# Altium footprint library self_pcblib v1.8.6.PcbLib: 123 footprints (part 4 of 8)
Each footprint in its own frame and in the unit in brackets; x right, y up, seen from the top. Pads: shape width x height; smd on the part's side, far side on the other; paste and mask are expansions set on the pad; w line width, h text height; cw(c..) or ccw(c..) is an arc to the next point about the centre after c.
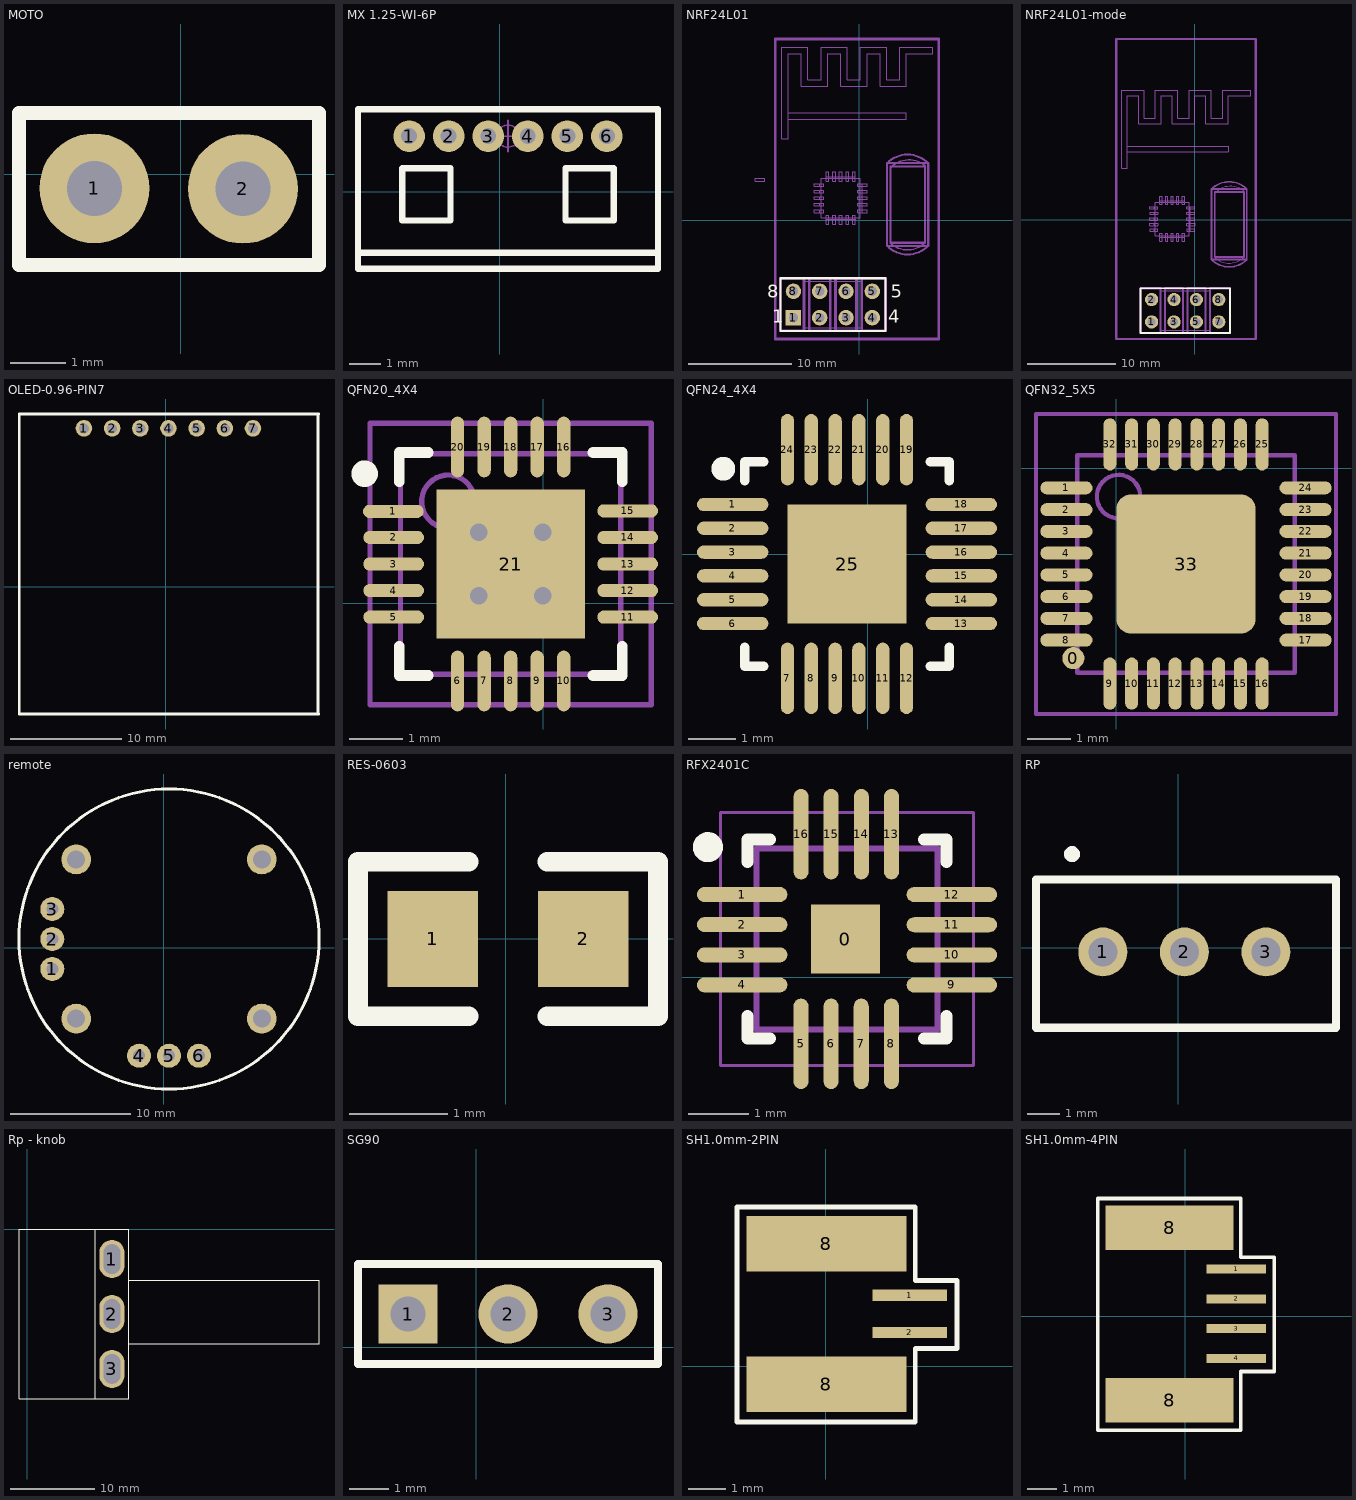
[diagram p3: the footprints below, top view; thin cyan lines are the x and y axes]

## MOTO [mm]
pads (2):
  round 2 hole 1: 1(-1.575,-0.254) 2(1.129,-0.262)
Top Overlay:
  lines w0.254: -2.946,-1.651 -2.946,1.118 2.515,1.118 2.515,-1.651 -2.946,-1.651

## MX 1.25-WI-6P [mm]
pads (6):
  round 1 hole 0.5: 1(-2.859,1.755) 2(-1.609,1.755) 3(-0.359,1.755) 4(0.891,1.755) 5(2.141,1.755) 6(3.391,1.755)
Top Overlay:
  lines w0.2: -4.473,-1.928 5.005,-1.928 ; -4.473,-2.436 5.005,-2.436 5.005,2.605 -4.473,2.605 -4.473,-2.436 ; -3.076,-0.912 -1.552,-0.912 -1.552,0.739 -3.076,0.739 -3.076,-0.912 ; 2.084,-0.912 3.608,-0.912 3.608,0.739 2.084,0.739 2.084,-0.912
Mechanical 15:
  circle w0.05: c0.266,1.755 r0.35
  lines w0.05: -0.234,1.755 0.766,1.755 ; 0.266,1.255 0.266,2.255
3D body "MOLEX1.25-WI-6P.STEP": height 3.35, standoff -2.1, extent -4.359,-2.295 4.891,2.605

## NRF24L01 [mm]
pads (8):
  rect 1.5x1.5 hole 0.9: 1(-6.35,-9.398)
  round 1.5 hole 0.9: 2(-3.81,-9.398) 3(-1.27,-9.398) 4(1.27,-9.398) 5(1.27,-6.858) 6(-1.27,-6.858) 7(-3.81,-6.858) 8(-6.35,-6.858)
Top Overlay:
  lines w0.2: -7.62,-10.668 -7.62,-5.588 2.54,-5.588 2.54,-10.668 -7.62,-10.668
  text "8" at -8.89,-7.493 h1.27
  text "4" at 2.794,-9.906 h1.27
  text "1" at -8.382,-9.906 h1.27
  text "5" at 3.048,-7.493 h1.27
Mechanical 1:
  drawing of 171 lines, arcs and shapes, not listed
3D body: height 3.01, standoff 3, extent -6.858,9.779 4.572,10.414
3D body: height 3.01, standoff 3, extent -7.493,7.874 7.112,16.764
3D body: height 3.25, standoff 3, extent -0.635,3.81 -0.381,4.219
3D body: height 3.25, standoff 3, extent -1.27,3.81 -1.016,4.219
3D body: height 3.25, standoff 3, extent -1.905,3.81 -1.651,4.219
3D body: height 3.25, standoff 3, extent -2.54,3.81 -2.286,4.219
3D body: height 3.25, standoff 3, extent -3.175,3.81 -2.921,4.229
3D body: height 3.25, standoff 3, extent -3.81,3.302 -3.429,3.556
3D body: height 3.25, standoff 3, extent -3.828,2.667 -3.429,2.921
3D body: height 3.25, standoff 3, extent -3.828,2.032 -3.429,2.286
3D body: height 3.25, standoff 3, extent -3.828,1.397 -3.429,1.651
3D body: height 3.25, standoff 3, extent -3.828,0.762 -3.429,1.016
3D body: height 3.25, standoff 3, extent -3.175,0.099 -2.921,0.508
3D body: height 3.25, standoff 3, extent -2.54,0.099 -2.286,0.508
3D body: height 3.25, standoff 3, extent -1.918,0.099 -1.651,0.508
3D body: height 3.25, standoff 3, extent -1.27,0.099 -1.016,0.508
3D body: height 3.25, standoff 3, extent -0.635,0.089 -0.381,0.508
3D body: height 3.25, standoff 3, extent -0.127,0.762 0.282,1.016
3D body: height 3.25, standoff 3, extent -0.127,1.397 0.282,1.651
3D body: height 3.25, standoff 3, extent -0.127,2.032 0.282,2.286
3D body: height 3.25, standoff 3, extent -0.127,2.667 0.282,2.921
3D body: height 3.25, standoff 3, extent -0.127,3.302 0.282,3.556
3D body: height 3.1, standoff 3, extent -3.175,4.229 -2.921,4.699
3D body: height 3.1, standoff 3, extent -2.54,4.229 -2.286,4.699
3D body: height 3.1, standoff 3, extent -1.905,4.219 -1.651,4.699
3D body: height 3.1, standoff 3, extent -1.27,4.229 -1.016,4.699
3D body: height 3.1, standoff 3, extent -0.648,4.219 -0.381,4.699
3D body: height 3.1, standoff 3, extent 0.282,3.302 0.762,3.556
3D body: height 3.1, standoff 3, extent 0.282,2.667 0.762,2.921
3D body: height 3.1, standoff 3, extent 0.282,2.032 0.762,2.286
3D body: height 3.1, standoff 3, extent 0.282,1.397 0.762,1.651
3D body: height 3.1, standoff 3, extent 0.282,0.762 0.762,1.016
3D body: height 3.1, standoff 3, extent -0.635,-0.381 -0.381,0.099
3D body: height 3.1, standoff 3, extent -1.27,-0.381 -1.016,0.099
3D body: height 3.1, standoff 3, extent -1.905,-0.381 -1.651,0.099
3D body: height 3.1, standoff 3, extent -2.54,-0.381 -2.286,0.099
3D body: height 3.1, standoff 3, extent -3.175,-0.381 -2.908,0.099
3D body: height 3.1, standoff 3, extent -4.318,0.762 -3.828,1.016
3D body: height 3.1, standoff 3, extent -4.318,1.397 -3.828,1.651
3D body: height 3.1, standoff 3, extent -4.313,2.032 -3.823,2.286
3D body: height 3.1, standoff 3, extent -4.318,2.667 -3.828,2.921
3D body: height 3.1, standoff 3, extent -4.318,3.302 -3.81,3.556
3D body: height 3.5, standoff 3, extent -3.683,0.254 0.127,4.064
3D body: height 5, standoff 3.5, extent 3.048,-2.159 6.35,5.207
3D body: height 5, standoff 3, extent 3.11,-2.736 6.543,0.69
3D body: height 5, standoff 3, extent 2.983,2.598 6.416,6.024
3D body: height 3.5, standoff 3, extent 2.586,-3.561 6.778,0.622
3D body: height 3.5, standoff 3, extent 2.586,2.439 6.778,6.622
3D body: height 3.5, standoff 3, extent 2.682,-2.461 6.682,5.539
3D body: height 4, standoff 0, extent 0.921,-9.748 1.62,-9.051
3D body: height 4, standoff 0, extent 0.921,-7.208 1.62,-6.511
3D body: height 4, standoff 0, extent -1.619,-7.208 -0.92,-6.511
3D body: height 4, standoff 0, extent -1.619,-9.748 -0.92,-9.051
3D body: height 4, standoff 0, extent -4.159,-9.748 -3.46,-9.051
3D body: height 4, standoff 0, extent -4.159,-7.208 -3.461,-6.511
3D body: height 4, standoff 0, extent -6.699,-7.208 -6.001,-6.511
3D body: height 4, standoff 0, extent -6.699,-9.748 -6.001,-9.051
3D body: height 4, standoff 0, extent -6.699,-9.748 -6,-9.051
3D body: height 4, standoff 0, extent -6.699,-7.208 -6,-6.511
3D body: height 4, standoff 0, extent -4.159,-9.748 -3.46,-9.051
3D body: height 4, standoff 0, extent -4.159,-7.208 -3.46,-6.511
3D body: height 4, standoff 0, extent -1.619,-9.748 -0.92,-9.051
3D body: height 4, standoff 0, extent -1.619,-7.208 -0.92,-6.511
3D body: height 4, standoff 0, extent 0.921,-9.748 1.62,-9.051
3D body: height 4, standoff 0, extent 0.921,-7.208 1.619,-6.511
3D body: height 3, standoff 2, extent -8.118,-11.461 7.682,17.539
3D body: height 2, standoff 0, extent -7.62,-10.668 -5.334,-5.588
3D body: height 2, standoff 0, extent -5.334,-10.361 -4.826,-5.861
3D body: height 2, standoff 0, extent -4.826,-10.668 -2.794,-5.588
3D body: height 2, standoff 0, extent -2.818,-10.361 -2.286,-5.861
3D body: height 2, standoff 0, extent -2.286,-10.668 -0.254,-5.588
3D body: height 2, standoff 0, extent -0.254,-10.361 0.254,-5.861
3D body: height 2, standoff 0, extent 0.254,-10.668 2.54,-5.588

## NRF24L01-mode [mm]
pads (8):
  round 1.5 hole 0.9: 1(-4.902,-11.582) 2(-4.902,-9.042) 3(-2.362,-11.582) 4(-2.362,-9.042) 5(0.178,-11.582) 6(0.178,-9.042) 7(2.718,-11.582) 8(2.718,-9.042)
Top Overlay:
  lines w0.2: -6.172,-12.852 -6.172,-7.772 3.988,-7.772 3.988,-12.852 -6.172,-12.852
Mechanical 1:
  drawing of 167 lines, arcs and shapes, not listed
3D body: height 3.01, standoff 3, extent -7.645,7.722 3.785,8.357
3D body: height 3.01, standoff 3, extent -8.28,5.817 6.325,14.707
3D body: height 3.25, standoff 3, extent -1.422,1.753 -1.168,2.162
3D body: height 3.25, standoff 3, extent -2.057,1.753 -1.803,2.162
3D body: height 3.25, standoff 3, extent -2.692,1.753 -2.438,2.162
3D body: height 3.25, standoff 3, extent -3.327,1.753 -3.073,2.162
3D body: height 3.25, standoff 3, extent -3.962,1.753 -3.708,2.172
3D body: height 3.25, standoff 3, extent -4.597,1.245 -4.216,1.499
3D body: height 3.25, standoff 3, extent -4.615,0.61 -4.216,0.864
3D body: height 3.25, standoff 3, extent -4.615,-0.025 -4.216,0.229
3D body: height 3.25, standoff 3, extent -4.615,-0.66 -4.216,-0.406
3D body: height 3.25, standoff 3, extent -4.615,-1.295 -4.216,-1.041
3D body: height 3.25, standoff 3, extent -3.962,-1.958 -3.708,-1.549
3D body: height 3.25, standoff 3, extent -3.327,-1.958 -3.073,-1.549
3D body: height 3.25, standoff 3, extent -2.705,-1.958 -2.438,-1.549
3D body: height 3.25, standoff 3, extent -2.057,-1.958 -1.803,-1.549
3D body: height 3.25, standoff 3, extent -1.422,-1.968 -1.168,-1.549
3D body: height 3.25, standoff 3, extent -0.914,-1.295 -0.505,-1.041
3D body: height 3.25, standoff 3, extent -0.914,-0.66 -0.505,-0.406
3D body: height 3.25, standoff 3, extent -0.914,-0.025 -0.505,0.229
3D body: height 3.25, standoff 3, extent -0.914,0.61 -0.505,0.864
3D body: height 3.25, standoff 3, extent -0.914,1.245 -0.505,1.499
3D body: height 3.1, standoff 3, extent -3.962,2.172 -3.708,2.642
3D body: height 3.1, standoff 3, extent -3.327,2.172 -3.073,2.642
3D body: height 3.1, standoff 3, extent -2.692,2.162 -2.438,2.642
3D body: height 3.1, standoff 3, extent -2.057,2.172 -1.803,2.642
3D body: height 3.1, standoff 3, extent -1.435,2.162 -1.168,2.642
3D body: height 3.1, standoff 3, extent -0.505,1.245 -0.025,1.499
3D body: height 3.1, standoff 3, extent -0.505,0.61 -0.025,0.864
3D body: height 3.1, standoff 3, extent -0.505,-0.025 -0.025,0.229
3D body: height 3.1, standoff 3, extent -0.505,-0.66 -0.025,-0.406
3D body: height 3.1, standoff 3, extent -0.505,-1.295 -0.025,-1.041
3D body: height 3.1, standoff 3, extent -1.422,-2.438 -1.168,-1.958
3D body: height 3.1, standoff 3, extent -2.057,-2.438 -1.803,-1.958
3D body: height 3.1, standoff 3, extent -2.692,-2.438 -2.438,-1.958
3D body: height 3.1, standoff 3, extent -3.327,-2.438 -3.073,-1.958
3D body: height 3.1, standoff 3, extent -3.962,-2.438 -3.695,-1.958
3D body: height 3.1, standoff 3, extent -5.105,-1.295 -4.615,-1.041
3D body: height 3.1, standoff 3, extent -5.105,-0.66 -4.615,-0.406
3D body: height 3.1, standoff 3, extent -5.1,-0.025 -4.61,0.229
3D body: height 3.1, standoff 3, extent -5.105,0.61 -4.615,0.864
3D body: height 3.1, standoff 3, extent -5.105,1.245 -4.597,1.499
3D body: height 3.5, standoff 3, extent -4.47,-1.803 -0.66,2.007
3D body: height 5, standoff 3.5, extent 2.261,-4.216 5.563,3.15
3D body: height 5, standoff 3, extent 2.322,-4.793 5.755,-1.367
3D body: height 5, standoff 3, extent 2.195,0.54 5.628,3.967
3D body: height 3.5, standoff 3, extent 1.799,-5.619 5.991,-1.435
3D body: height 3.5, standoff 3, extent 1.799,0.381 5.991,4.565
3D body: height 3.5, standoff 3, extent 1.895,-4.518 5.895,3.482
3D body: height 4, standoff 0, extent 2.369,-11.933 3.067,-11.235
3D body: height 4, standoff 0, extent 2.369,-9.393 3.067,-8.695
3D body: height 4, standoff 0, extent -0.171,-9.392 0.527,-8.695
3D body: height 4, standoff 0, extent -0.171,-11.932 0.527,-11.235
3D body: height 4, standoff 0, extent -2.711,-11.933 -2.013,-11.235
3D body: height 4, standoff 0, extent -2.711,-9.392 -2.013,-8.695
3D body: height 4, standoff 0, extent -5.251,-9.393 -4.553,-8.695
3D body: height 4, standoff 0, extent -5.251,-11.933 -4.553,-11.235
3D body: height 4, standoff 0, extent -5.251,-11.933 -4.553,-11.235
3D body: height 4, standoff 0, extent -5.251,-9.392 -4.553,-8.695
3D body: height 4, standoff 0, extent -2.711,-11.933 -2.013,-11.235
3D body: height 4, standoff 0, extent -2.711,-9.393 -2.013,-8.695
3D body: height 4, standoff 0, extent -0.171,-11.933 0.527,-11.235
3D body: height 4, standoff 0, extent -0.171,-9.393 0.527,-8.695
3D body: height 4, standoff 0, extent 2.369,-11.933 3.067,-11.235
3D body: height 4, standoff 0, extent 2.369,-9.392 3.067,-8.695
3D body: height 3, standoff 2, extent -8.905,-13.518 6.895,15.482
3D body: height 2, standoff 0, extent -6.172,-12.852 -3.886,-7.772
3D body: height 2, standoff 0, extent -3.886,-12.545 -3.378,-8.045
3D body: height 2, standoff 0, extent -3.378,-12.852 -1.346,-7.772
3D body: height 2, standoff 0, extent -1.37,-12.545 -0.838,-8.045
3D body: height 2, standoff 0, extent -0.838,-12.852 1.194,-7.772
3D body: height 2, standoff 0, extent 1.194,-12.545 1.702,-8.045
3D body: height 2, standoff 0, extent 1.702,-12.852 3.988,-7.772

## OLED-0.96-PIN7 [mm]
pads (7):
  round 1.5 hole 0.9: 1(-7.366,14.301) 2(-4.826,14.301) 3(-2.286,14.301) 4(0.254,14.301) 5(2.794,14.301) 6(5.334,14.301) 7(7.874,14.301)
Top Overlay:
  lines w0.254: -13.2,-11.456 13.8,-11.456 ; -13.2,-11.405 -13.2,15.595 13.8,15.595 ; 13.724,-11.456 13.724,15.595
3D body "OLED-0.96.step": height 3.22, standoff -0.62, extent -12.946,-9.932 13.754,12.272

## QFN20_4X4 [mil]
pads (21):
  oval 45x9.84 smd: 1(-111,68) 2(-110.74,48.69) 3(-110.74,29) 4(-110.74,9.31) 5(-110.74,-10.37) 11(62.74,-10.37) 12(62.74,9.31) 13(62.74,29) 14(62.74,48.69) 15(62.74,68.37)
  oval 9.84x45 smd: 6(-63.37,-57.74) 7(-43.69,-57.74) 8(-24,-57.74) 9(-4.32,-57.74) 10(15.37,-57.74) 16(15.37,115.74) 17(-4.32,115.74) 18(-24,115.74) 19(-43.69,115.74) 20(-63.37,115.74)
  rect 110.24x110.24 smd: 21(-24,29)
via -47.62,52.62 diameter 25.98 hole 12.99
via -0.38,52.62 diameter 25.98 hole 12.99
via -47.62,5.38 diameter 25.98 hole 12.99
via -0.38,5.38 diameter 25.98 hole 12.99
Top Overlay:
  circle w9.84: c-132.27,95.93 r4.92
  lines w7.87: -106.68,-32.02 -106.68,-53.68 -85.02,-53.68 ; -106.68,90.02 -106.68,111.68 -85.02,111.68 ; 37.02,-53.68 58.68,-53.68 58.68,-32.02 ; 37.02,111.68 58.68,111.68 58.68,90.02
Mechanical 13:
  circle w3.94: c-70.26,75.26 r19.68
  lines w3.94: -105.69,-52.69 -105.69,110.69 57.69,110.69 57.69,-52.69 -105.69,-52.69
Mechanical 15:
  lines w3.94: -43.69,29 -4.32,29 ; -24,9.31 -24,48.69 ; -128.33,-75.33 -128.33,133.33 80.33,133.33 80.33,-75.33 -128.33,-75.33
3D body "User Library-QFN20_4x4x0_8.STEP": height 30.71, standoff -0.79, extent -103.13,-50.27 55.13,108

## QFN24_4X4 [mm]
pads (25):
  oval 1.5x0.28 smd: 1(-2.832,1.047) 2(-2.832,0.547) 3(-2.832,0.047) 4(-2.832,-0.453) 5(-2.832,-0.953) 6(-2.832,-1.453) 13(1.968,-1.453) 14(1.968,-0.953) 15(1.968,-0.453) 16(1.968,0.047) 17(1.968,0.547) 18(1.968,1.047)
  oval 0.28x1.5 smd: 7(-1.682,-2.603) 8(-1.182,-2.603) 9(-0.682,-2.603) 10(-0.182,-2.603) 11(0.318,-2.603) 12(0.818,-2.603) 19(0.818,2.197) 20(0.318,2.197) 21(-0.182,2.197) 22(-0.682,2.197) 23(-1.182,2.197) 24(-1.682,2.197)
  rect 2.5x2.5 smd: 25(-0.432,-0.203)
Top Overlay:
  circle w0.25: c-3.032,1.797 r0.125
  lines w0.2: -2.582,-1.953 -2.582,-2.353 -2.182,-2.353 ; -2.582,1.547 -2.582,1.947 -2.182,1.947 ; 1.318,-2.353 1.718,-2.353 1.718,-1.953 ; 1.318,1.947 1.718,1.947 1.718,1.547
3D body "User Library-QFN24.STEP": height 0.9, standoff 0, extent -2.435,-2.208 1.575,1.802

## QFN32_5X5 [mm]
pads (34):
  round 0.508 smd: 0(-0.991,-4.369)
  oval 1.2x0.3 smd: 1(-1.15,-0.452) 2(-1.15,-0.952) 3(-1.15,-1.452) 4(-1.15,-1.952) 5(-1.15,-2.452) 6(-1.15,-2.952) 7(-1.15,-3.452) 8(-1.15,-3.952) 17(4.35,-3.952) 18(4.35,-3.452) 19(4.35,-2.952) 20(4.35,-2.452) 21(4.35,-1.952) 22(4.35,-1.452) 23(4.35,-0.952) 24(4.35,-0.452)
  oval 0.3x1.2 smd: 9(-0.15,-4.952) 10(0.35,-4.952) 11(0.85,-4.952) 12(1.35,-4.952) 13(1.85,-4.952) 14(2.35,-4.952) 15(2.85,-4.952) 16(3.35,-4.952) 25(3.35,0.548) 26(2.85,0.548) 27(2.35,0.548) 28(1.85,0.548) 29(1.35,0.548) 30(0.85,0.548) 31(0.35,0.548) 32(-0.15,0.548)
  rrect20% 3.2x3.2 smd: 33(1.6,-2.202)
Mechanical 13:
  circle w0.1: c0.05,-0.652 r0.5
  lines w0.1: -0.9,-4.702 -0.9,0.298 4.1,0.298 4.1,-4.702 -0.9,-4.702
Mechanical 15:
  lines w0.1: 1.1,-2.202 2.1,-2.202 ; 1.6,-2.702 1.6,-1.702 ; -1.85,-5.652 -1.85,1.248 5.05,1.248 5.05,-5.652 -1.85,-5.652
3D body "QFN32 (FTDI).STEP": height 0.8, standoff -0.05, extent -0.874,-4.742 4.126,0.258

## remote [mm]
pads (10):
  round 2 hole 1: 1(-9.329,-1.749) 2(-9.329,0.751) 3(-9.329,3.251) 4(-2.079,-8.999) 5(0.421,-8.999) 6(2.921,-8.999)
  round 2.5 hole 1.5: ""(-7.329,-5.899) ""(-7.329,7.401) ""(8.171,-5.899) ""(8.171,7.401)
Top Overlay:
  circle w0.254: c0.421,0.751 r12.53

## RES-0603 [mm]
pads (2):
  rect 0.93x0.98 smd: 1(-0.745,0) 2(0.795,0)
Top Overlay:
  lines w0.2: -0.375,-0.79 -1.51,-0.79 -1.51,0.79 -0.375,0.79 ; 0.425,-0.79 1.56,-0.79 1.56,0.79 0.425,0.79
3D body "User Library-RES_1609-0603.STEP": height 0.56, standoff 0, extent -0.825,-0.4 0.876,0.4

## RFX2401C [mm] "QFN3*3"
pads (17):
  rect 1.143x1.143 smd: 0(3.302,0.635)
  oval 1.5x0.25 smd: 1(1.588,1.373) 2(1.588,0.873) 3(1.588,0.373) 4(1.588,-0.127) 9(5.067,-0.128) 10(5.067,0.372) 11(5.067,0.872) 12(5.067,1.372)
  oval 0.25x1.5 smd: 5(2.564,-1.104) 6(3.064,-1.104) 7(3.564,-1.104) 8(4.064,-1.104) 13(4.065,2.374) 14(3.565,2.374) 15(3.065,2.374) 16(2.565,2.374)
Top Overlay:
  circle w0.25: c1.018,2.159 r0.125
  lines w0.2: 1.677,-0.64 1.677,-1.015 2.052,-1.015 ; 1.677,1.91 1.677,2.285 2.052,2.285 ; 4.602,-1.015 4.977,-1.015 4.977,-0.64 ; 4.602,2.285 4.977,2.285 4.977,1.91
Mechanical 13:
  lines w0.1: 1.827,-0.865 4.827,-0.865 4.827,2.135 1.827,2.135 1.827,-0.865
Mechanical 15:
  lines w0.05: 1.227,-1.465 5.427,-1.465 5.427,2.735 1.227,2.735 1.227,-1.465
  lines w0.1: 2.827,0.635 3.827,0.635 ; 3.327,0.135 3.327,1.135
3D body: height 1, standoff 0.05, extent 1.827,-0.865 4.827,2.135

## RP [mil]
pads (3):
  round 60 hole 35.43: 1(-92.36,-5) 2(7.64,-5) 3(107.64,-5)
Top Overlay:
  circle w10: c-130.18,115 r4.81
  lines w10: -174.36,-98 193.64,-98 193.64,84 -174.36,84 -174.36,-98
3D body "Trimming Potentiometer Vertical 3296W 104 - 100k.step": height 457.87, standoff -251.97, extent -178.96,-102.16 196.24,88

## Rp - knob [mm]
pads (3):
  oval 3x4.5 hole 2 slot 3.5 at 90 deg: 1(10,-3.5) 2(10,-10) 3(10,-16.5)
Top Overlay:
  lines w0.127: 8,-20 8,0 ; 12,-13.5 34.5,-13.5 34.5,-6 12,-6 ; -1,-20 12,-20 12,0 -1,0 -1,-20

## SG90 [mm]
pads (3):
  rect 1.5x1.5 hole 0.9: 1(-1.727,0.838)
  round 1.5 hole 0.9: 2(0.813,0.838) 3(3.353,0.838)
Top Overlay:
  lines w0.2: -2.997,-0.432 -2.997,2.108 4.623,2.108 4.623,-0.432 -2.997,-0.432
3D body "1001-3.STEP": height 8.54, standoff -3, extent -3.023,-0.457 4.597,2.083
3D body "User Library-SG90-1.STEP": height 12.06, standoff -0.19, extent -3.073,-0.483 28.423,36.961

## SH1.0mm-2PIN [mm]
pads (4):
  rect 2x0.3 smd: 1(2.269,1.914) 2(2.269,0.914)
  rect 4.3x1.5 smd: 8(0.025,-0.483) 8(0.025,3.302)
Top Overlay:
  lines w0.127: -2.388,-1.499 2.419,-1.499 2.419,0.483 3.544,0.483 3.544,2.314 2.419,2.314 2.419,4.293 -2.388,4.293 -2.388,-1.499

## SH1.0mm-4PIN [mm]
pads (6):
  rect 2x0.3 smd: 1(1.71,1.584) 2(1.71,0.584) 3(1.71,-0.416) 4(1.71,-1.416)
  rect 4.3x1.5 smd: 8(-0.533,-2.819) 8(-0.533,2.972)
Top Overlay:
  lines w0.127: -2.946,-3.835 1.86,-3.835 1.86,-1.854 2.985,-1.854 2.985,1.984 1.86,1.984 1.86,3.962 -2.946,3.962 -2.946,-3.835